# Altium integrated library controleo3_clone.IntLib: 45 symbols
Pins are listed as number, name and electrical type; pins without a type are passive.

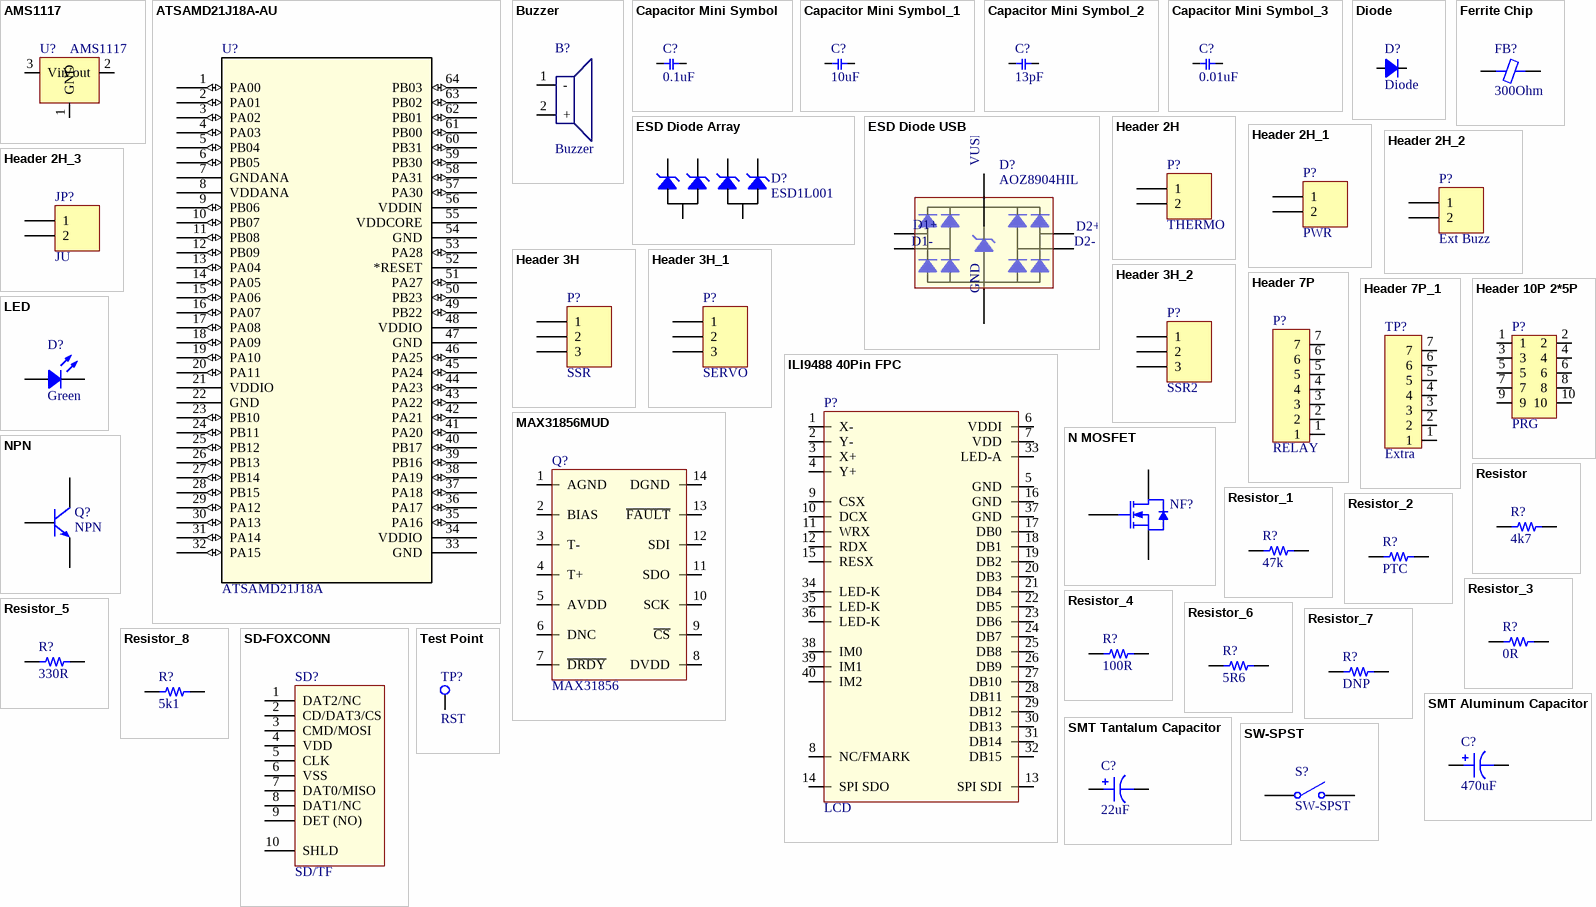
[diagram p0: symbols AMS1117 to Test Point]

## AMS1117
designator U?
Fixed Voltage Regulator; Mfr 1: Texas Instruments; Notes: *
footprint SOT-223 2,4 Jumper (SOT-223/SC-73; 4 Leads; Body 6.7 x 7.3 mm, inc. leads (LxW max))
pins: 1 GND, 2 Vout, 3 Vin (power)

## ATSAMD21J18A-AU
designator U?, comment ATSAMD21J18A
No Description Available; Mfr_Name: Microchip; Manufacturer_Part_Number: ATSAMD21J18A-AU; Copyright: Copyright (C) 2022 Ultra Librarian. All rights reserved.; RefDes: RefDes; Type: DEV
footprint TQFP64_10x10MC_MCH
footprint TQFP64_10x10MC_MCH-M
pins: 1 PA00 (io), 2 PA01 (io), 3 PA02 (io), 4 PA03 (io), 5 PB04 (io), 6 PB05 (io), 7 GNDANA, 8 VDDANA (power), 9 PB06 (io), 10 PB07 (io), 11 PB08 (io), 12 PB09 (io), 13 PA04 (io), 14 PA05 (io), 15 PA06 (io), 16 PA07 (io), 17 PA08 (io), 18 PA09 (io), 19 PA10 (io), 20 PA11 (io), 21 VDDIO (power), 22 GND, 23 PB10 (io), 24 PB11 (io), 25 PB12 (io), 26 PB13 (io), 27 PB14 (io), 28 PB15 (io), 29 PA12 (io), 30 PA13 (io), 31 PA14 (io), 32 PA15 (io), 33 GND, 34 VDDIO (power), 35 PA16 (io), 36 PA17 (io), 37 PA18 (io), 38 PA19 (io), 39 PB16 (io), 40 PB17 (io), 41 PA20 (io), 42 PA21 (io), 43 PA22 (io), 44 PA23 (io), 45 PA24 (io), 46 PA25 (io), 47 GND, 48 VDDIO (power), 49 PB22 (io), 50 PB23 (io), 51 PA27 (io), 52 *RESET, 53 PA28 (io), 54 GND, 55 VDDCORE (power), 56 VDDIN (power), 57 PA30 (io), 58 PA31 (io), 59 PB30 (io), 60 PB31 (io), 61 PB00 (io), 62 PB01 (io), 63 PB02 (io), 64 PB03 (io)

## Buzzer
designator B?
footprint Buzzer
footprint Buzzer - SMD 5mm
footprint Buzzer - Multi (Multiple Buzzer Footprint)
pins: 1 -, 2 +

## Capacitor Mini Symbol
designator C?, comment 0.1uF
SMT Capacitor; Value: 0.1uF
footprint CAP 0805/2012 RF (Chip Capacitor, 2-Leads, Body 2.00x1.20mm, IPC High Density)
footprint CAP 1206/3216 - 0.8MM (Chip Capacitor, 2-Leads, Body 3.25x1.60mm, IPC Medium Density)
footprint RES 0805/2012 RF Min (Chip Resistor, 2-Leads, Body 2.00x1.25mm, IPC High Density)
footprint CAP 0603 RF (0603 RF)
footprint CAP ALUM 8.3MM (Aluminum Electrolytic Capacitor, Body 8.30x8.30x10.50mm, IPC Low Density)
footprint CAP 1210/3225 - 1.4MM (Chip Capacitor, 2-Leads, Body 3.20x2.50mm, IPC Medium Density)
pins: 1, 2

## Capacitor Mini Symbol_1
designator C?, comment 10uF
SMT Capacitor; Value: 10uF
footprint CAP 0805/2012 RF (Chip Capacitor, 2-Leads, Body 2.00x1.20mm, IPC High Density)
footprint CAP 1206/3216 - 0.8MM (Chip Capacitor, 2-Leads, Body 3.25x1.60mm, IPC Medium Density)
footprint RES 0805/2012 RF Min (Chip Resistor, 2-Leads, Body 2.00x1.25mm, IPC High Density)
footprint CAP 0603 RF (0603 RF)
footprint CAP ALUM 8.3MM (Aluminum Electrolytic Capacitor, Body 8.30x8.30x10.50mm, IPC Low Density)
footprint CAP 1210/3225 - 1.4MM (Chip Capacitor, 2-Leads, Body 3.20x2.50mm, IPC Medium Density)
pins: 1, 2

## Capacitor Mini Symbol_2
designator C?, comment 13pF
SMT Capacitor; Value: 13pF
footprint CAP 0805/2012 RF (Chip Capacitor, 2-Leads, Body 2.00x1.20mm, IPC High Density)
footprint CAP 1206/3216 - 0.8MM (Chip Capacitor, 2-Leads, Body 3.25x1.60mm, IPC Medium Density)
footprint RES 0805/2012 RF Min (Chip Resistor, 2-Leads, Body 2.00x1.25mm, IPC High Density)
footprint CAP 0603 RF (0603 RF)
footprint CAP ALUM 8.3MM (Aluminum Electrolytic Capacitor, Body 8.30x8.30x10.50mm, IPC Low Density)
footprint CAP 1210/3225 - 1.4MM (Chip Capacitor, 2-Leads, Body 3.20x2.50mm, IPC Medium Density)
pins: 1, 2

## Capacitor Mini Symbol_3
designator C?, comment 0.01uF
SMT Capacitor; Value: 0.01uF
footprint CAP 0805/2012 RF (Chip Capacitor, 2-Leads, Body 2.00x1.20mm, IPC High Density)
footprint CAP 1206/3216 - 0.8MM (Chip Capacitor, 2-Leads, Body 3.25x1.60mm, IPC Medium Density)
footprint RES 0805/2012 RF Min (Chip Resistor, 2-Leads, Body 2.00x1.25mm, IPC High Density)
footprint CAP 0603 RF (0603 RF)
footprint CAP ALUM 8.3MM (Aluminum Electrolytic Capacitor, Body 8.30x8.30x10.50mm, IPC Low Density)
footprint CAP 1210/3225 - 1.4MM (Chip Capacitor, 2-Leads, Body 3.20x2.50mm, IPC Medium Density)
pins: 1, 2

## Diode
designator D?
footprint SOD-123
footprint SMA (DO-214-AC/SMA; 2 C-Bend Leads; Body 5 x 2.7 mm, inc. leads (LxW))
footprint SMB (DO-214-AA/SMB; 2 C-Bend Leads; Body 5.3 x 3.6 mm, inc. leads (LxW))
footprint SOD-323 (SOD-323/SC-76; 2 Leads; Body 1.7 x 1.3 mm, (LxW))
footprint SOD-123F
pins: 1, 2

## ESD Diode Array
designator D?, comment ESD1L001
ESD Protection Diode Array
footprint SC-88
footprint SC-70-6 - NC7WZ16-D
pins: 1, 2, 3, 4, 5, 6

## ESD Diode USB
designator D?, comment AOZ8904HIL
ESD Protection Diode
footprint SOT-23 (6) (SOT-23; 6 Leads; Body 3 x 3 mm, inc. leads (LxW max))
footprint SC-88
footprint SC-70-6
footprint SOT-23 (6) - Medium (SOT-23; 6 Leads; Body 3 x 3 mm, inc. leads (LxW max))
pins: 1 D1+, 2 GND, 3 D2-, 4 D2+, 5 VUSB, 6 D1-

## Ferrite Chip
designator FB?, comment 300Ohm
SMT Ferrite Chip
footprint RES 0603/1608 RF (Chip Resistor, 2-Leads, Body 1.60x0.80mm, IPC High Density)
pins: 1, 2

## Header 2H
designator P?, comment THERMO
Header, 2-Pin, Right Angle; LatestRevisionDate: 17-Jul-2002; LatestRevisionNote: Re-released for DXP Platform.; Publisher: Altium Limited
signal-integrity model Connector
footprint XH2 (Connector; Header; 2 Position)
footprint W237-102
footprint XT60BW (XT60 Connector)
footprint TJ8-2 (Connector; Header; 3 Position)
footprint Molex 3.96 (Connector; Header; 3 Position)
footprint J2 (Connector; Header; 2 Position)
footprint SH 1.0 * 2 (SH 1.0 * 2 Pins)
footprint XT30BW (XT60 Connector)
footprint EH 2P (EH 2 Pin Header)
footprint PH2 2 Pin (Connector; Header; 2 Position Vertical)
pins: 1, 2

## Header 2H_1
designator P?, comment PWR
Header, 2-Pin, Right Angle; LatestRevisionDate: 17-Jul-2002; LatestRevisionNote: Re-released for DXP Platform.; Publisher: Altium Limited
signal-integrity model Connector
footprint XH2 (Connector; Header; 2 Position)
footprint W237-102
footprint XT60BW (XT60 Connector)
footprint TJ8-2 (Connector; Header; 3 Position)
footprint Molex 3.96 (Connector; Header; 3 Position)
footprint J2 (Connector; Header; 2 Position)
footprint SH 1.0 * 2 (SH 1.0 * 2 Pins)
footprint XT30BW (XT60 Connector)
footprint EH 2P (EH 2 Pin Header)
footprint PH2 2 Pin (Connector; Header; 2 Position Vertical)
pins: 1, 2

## Header 2H_2
designator P?, comment Ext Buzz
Header, 2-Pin, Right Angle; LatestRevisionDate: 17-Jul-2002; LatestRevisionNote: Re-released for DXP Platform.; Publisher: Altium Limited
signal-integrity model Connector
footprint XH2 (Connector; Header; 2 Position)
footprint W237-102
footprint XT60BW (XT60 Connector)
footprint TJ8-2 (Connector; Header; 3 Position)
footprint Molex 3.96 (Connector; Header; 3 Position)
footprint J2 (Connector; Header; 2 Position)
footprint SH 1.0 * 2 (SH 1.0 * 2 Pins)
footprint XT30BW (XT60 Connector)
footprint EH 2P (EH 2 Pin Header)
footprint PH2 2 Pin (Connector; Header; 2 Position Vertical)
pins: 1, 2

## Header 2H_3
designator JP?, comment JU
Header, 2-Pin, Right Angle; LatestRevisionDate: 17-Jul-2002; LatestRevisionNote: Re-released for DXP Platform.; Publisher: Altium Limited
signal-integrity model Connector
footprint XH2 (Connector; Header; 2 Position)
footprint W237-102
footprint XT60BW (XT60 Connector)
footprint TJ8-2 (Connector; Header; 3 Position)
footprint Molex 3.96 (Connector; Header; 3 Position)
footprint J2 (Connector; Header; 2 Position)
footprint SH 1.0 * 2 (SH 1.0 * 2 Pins)
footprint XT30BW (XT60 Connector)
footprint EH 2P (EH 2 Pin Header)
footprint PH2 2 Pin (Connector; Header; 2 Position Vertical)
pins: 1, 2

## Header 3H
designator P?, comment SSR
Header, 3-Pin, Right Angle; LatestRevisionDate: 17-Jul-2002; LatestRevisionNote: Re-released for DXP Platform.; Publisher: Altium Limited
footprint HDR1X3H (Connector; Header; 3 Position; Right Angle)
signal-integrity model Connector
footprint XH3 (Connector; Header; 3 Position)
footprint W237-103
footprint TJ8-3 (Connector; Header; 3 Position)
footprint SH 1.0 * 3 (SH 1.0 * 3 Pins)
footprint JST-3-SMD
footprint 1X03_XH_LOCK
footprint DC044
footprint 2059-3
footprint GX12-3 (GX12 3Pin PCB Mount connector)
footprint PH2 3 Pin (Connector; Header; 3 Position Vertical)
footprint Header 3P - Outline (Header 3Pin)
footprint Header 3P (3 Pin Header)
pins: 1, 2, 3

## Header 3H_1
designator P?, comment SERVO
Header, 3-Pin, Right Angle; LatestRevisionDate: 17-Jul-2002; LatestRevisionNote: Re-released for DXP Platform.; Publisher: Altium Limited
footprint HDR1X3H (Connector; Header; 3 Position; Right Angle)
signal-integrity model Connector
footprint XH3 (Connector; Header; 3 Position)
footprint W237-103
footprint TJ8-3 (Connector; Header; 3 Position)
footprint SH 1.0 * 3 (SH 1.0 * 3 Pins)
footprint JST-3-SMD
footprint 1X03_XH_LOCK
footprint DC044
footprint 2059-3
footprint GX12-3 (GX12 3Pin PCB Mount connector)
footprint PH2 3 Pin (Connector; Header; 3 Position Vertical)
footprint Header 3P - Outline (Header 3Pin)
footprint Header 3P (3 Pin Header)
pins: 1, 2, 3

## Header 3H_2
designator P?, comment SSR2
Header, 3-Pin, Right Angle; LatestRevisionDate: 17-Jul-2002; LatestRevisionNote: Re-released for DXP Platform.; Publisher: Altium Limited
footprint HDR1X3H (Connector; Header; 3 Position; Right Angle)
signal-integrity model Connector
footprint XH3 (Connector; Header; 3 Position)
footprint W237-103
footprint TJ8-3 (Connector; Header; 3 Position)
footprint SH 1.0 * 3 (SH 1.0 * 3 Pins)
footprint JST-3-SMD
footprint 1X03_XH_LOCK
footprint DC044
footprint 2059-3
footprint GX12-3 (GX12 3Pin PCB Mount connector)
footprint PH2 3 Pin (Connector; Header; 3 Position Vertical)
footprint Header 3P - Outline (Header 3Pin)
footprint Header 3P (3 Pin Header)
pins: 1, 2, 3

## Header 7P
designator P?, comment RELAY
footprint Header 7P - Tall (7 Pin Header)
footprint Header 7P (7 Pin Header)
pins: 1, 2, 3, 4, 5, 6, 7

## Header 7P_1
designator TP?, comment Extra
footprint Header 7P - Tall (7 Pin Header)
footprint Header 7P (7 Pin Header)
pins: 1, 2, 3, 4, 5, 6, 7

## Header 10P 2*5P
designator P?, comment PRG
footprint Header 5*2P (Header 5*2Pin)
pins: 1, 2, 3, 4, 5, 6, 7, 8, 9, 10

## ILI9488 40Pin FPC
designator P?, comment LCD
footprint FPC 0.5 40Pin - Reverse (FPC 0.5 40Pin)
pins: 1 X- (power), 2 Y- (power), 3 X+ (power), 4 Y+ (power), 5 GND (power), 6 VDDI (power), 7 VDD (power), 8 NC/FMARK (power), 9 CSX (power), 10 DCX (power), 11 WRX (power), 12 RDX (power), 13 SPI SDI (power), 14 SPI SDO (power), 15 RESX (power), 16 GND (power), 17 DB0 (power), 18 DB1 (power), 19 DB2 (power), 20 DB3 (power), 21 DB4 (power), 22 DB5 (power), 23 DB6 (power), 24 DB7 (power), 25 DB8 (power), 26 DB9 (power), 27 DB10 (power), 28 DB11 (power), 29 DB12 (power), 30 DB13 (power), 31 DB14 (power), 32 DB15 (power), 33 LED-A (power), 34 LED-K (power), 35 LED-K (power), 36 LED-K (power), 37 GND (power), 38 IM0 (power), 39 IM1 (power), 40 IM2 (power)

## LED
designator D?, comment Green
Chip LED; Value: Green
footprint XP-E LED (CREE XP-E LED); pin to pad 1>Anode 2>Cathode
footprint OSRAM 3030 (OSRAM 3030 LED)
footprint Samsung 3030 (Samsung 3030 LED)
footprint 1206-OPTTRANS
footprint 3028
footprint RES 0603/1608 (Chip Resistor, 2-Leads, Body 1.60x0.80mm, IPC Medium Density)
footprint RES 0603/1608 RF (Chip Resistor, 2-Leads, Body 1.60x0.80mm, IPC High Density)
footprint LED 0603 Side View; pin to pad 1>2 2>1
footprint LED 0603 (Chip Capacitor, 2-Leads, Body 1.60x0.80mm, IPC High Density); pin to pad 1>2 2>1
footprint LED 0603/1608 RF - Red (Red LED 0603)
footprint LED 0603/1608 RF - Blue (Blue LED 0603)
footprint LED 3mm DIP (LED 3mm DIP package)
pins: 1, 2

## MAX31856MUD
designator Q?, comment MAX31856
footprint TSSOP14
pins: 1 AGND (power), 2 BIAS (power), 3 T- (power), 4 T+ (power), 5 AVDD (power), 6 DNC (power), 7 ~{DRDY} (power), 8 DVDD (power), 9 ~{CS} (power), 10 SCK (power), 11 SDO (power), 12 SDI (power), 13 ~{FAULT} (power), 14 DGND (power)

## N MOSFET
designator NF?
N-Channel MOSFET
footprint TO-252AA (D-PAK/TO-252-AA; 3 Leads (1 Cropped); Body 10.4 (inc. leads) x 6.7 mm (LxW max))
footprint SOT-223 (SOT-223/SC-73; 4 Leads; Body 6.7 x 7.3 mm, inc. leads (LxW max))
footprint SOT-23 (SOT-23; 3 Leads; Body 3.0 x 2.6 mm, inc. leads (LxW max)); pin to pad 3>2 4>3
footprint SOIC8; pin to pad 1>4 3>1 4>8
footprint SOT-23 (6) (SOT-23; 6 Leads; Body 3 x 3 mm, inc. leads (LxW max)); pin to pad 1>3 3>4 4>1，2，5，6
pins: 1 G, 3 S, 4 D

## NPN
designator Q?
NPN Transistor; Published: 8-Jun-2000; LatestRevisionDate: 29-May-2009; LatestRevisionNote: IPC-7351 Footprint Added.; PackageVersion: Aug-1999; PackageReference: SOT-23B; Publisher: Altium Limited; PackageDescription: 3-Pin SOT-23 Package 0.95 mm Pitch, 2.4 mm Lead Span
simulation model PNP
signal-integrity model PNP
footprint SC-75 (SOT-416/SC-90/SC-75; 3 Leads; Body 1.8 x 1.8 mm, inc. leads (LxW max)); pin to pad 1>2 2>1
footprint SOT-23 (SOT-23; 3 Leads; Body 3.0 x 2.6 mm, inc. leads (LxW max)); pin to pad 1>2 2>1
pins: 1 E, 2 B, 3 C

## Resistor
designator R?, comment 4k7
SMT Resistor; Value: 4k7
footprint RES 0805/2012 RF (Chip Resistor, 2-Leads, Body 2.00x1.25mm, IPC High Density)
footprint RES 1206/3216 RF (Chip Resistor, 2-Leads, Body 3.13x1.55mm, IPC High Density)
footprint CAP 1210/3225 - 1.2MM (Chip Capacitor, 2-Leads, Body 3.20x2.50mm, IPC Medium Density)
footprint RES 0603 RF (0603 Reflow)
footprint RES 2512 (Chip Resistor, 2-Leads, Body 3.13x1.55mm, IPC High Density)
pins: 1, 2

## Resistor_1
designator R?, comment 47k
SMT Resistor; Value: 47k
footprint RES 0805/2012 RF (Chip Resistor, 2-Leads, Body 2.00x1.25mm, IPC High Density)
footprint RES 1206/3216 RF (Chip Resistor, 2-Leads, Body 3.13x1.55mm, IPC High Density)
footprint CAP 1210/3225 - 1.2MM (Chip Capacitor, 2-Leads, Body 3.20x2.50mm, IPC Medium Density)
footprint RES 0603 RF (0603 Reflow)
footprint RES 2512 (Chip Resistor, 2-Leads, Body 3.13x1.55mm, IPC High Density)
pins: 1, 2

## Resistor_2
designator R?, comment PTC
SMT Resistor; Value: PTC
footprint RES 0805/2012 RF (Chip Resistor, 2-Leads, Body 2.00x1.25mm, IPC High Density)
footprint RES 1206/3216 RF (Chip Resistor, 2-Leads, Body 3.13x1.55mm, IPC High Density)
footprint CAP 1210/3225 - 1.2MM (Chip Capacitor, 2-Leads, Body 3.20x2.50mm, IPC Medium Density)
footprint RES 0603 RF (0603 Reflow)
footprint RES 2512 (Chip Resistor, 2-Leads, Body 3.13x1.55mm, IPC High Density)
pins: 1, 2

## Resistor_3
designator R?, comment 0R
SMT Resistor; Value: 0R
footprint RES 0805/2012 RF (Chip Resistor, 2-Leads, Body 2.00x1.25mm, IPC High Density)
footprint RES 1206/3216 RF (Chip Resistor, 2-Leads, Body 3.13x1.55mm, IPC High Density)
footprint CAP 1210/3225 - 1.2MM (Chip Capacitor, 2-Leads, Body 3.20x2.50mm, IPC Medium Density)
footprint RES 0603 RF (0603 Reflow)
footprint RES 2512 (Chip Resistor, 2-Leads, Body 3.13x1.55mm, IPC High Density)
pins: 1, 2

## Resistor_4
designator R?, comment 100R
SMT Resistor; Value: 100R
footprint RES 0805/2012 RF (Chip Resistor, 2-Leads, Body 2.00x1.25mm, IPC High Density)
footprint RES 1206/3216 RF (Chip Resistor, 2-Leads, Body 3.13x1.55mm, IPC High Density)
footprint CAP 1210/3225 - 1.2MM (Chip Capacitor, 2-Leads, Body 3.20x2.50mm, IPC Medium Density)
footprint RES 0603 RF (0603 Reflow)
footprint RES 2512 (Chip Resistor, 2-Leads, Body 3.13x1.55mm, IPC High Density)
pins: 1, 2

## Resistor_5
designator R?, comment 330R
SMT Resistor; Value: 330R
footprint RES 0805/2012 RF (Chip Resistor, 2-Leads, Body 2.00x1.25mm, IPC High Density)
footprint RES 1206/3216 RF (Chip Resistor, 2-Leads, Body 3.13x1.55mm, IPC High Density)
footprint CAP 1210/3225 - 1.2MM (Chip Capacitor, 2-Leads, Body 3.20x2.50mm, IPC Medium Density)
footprint RES 0603 RF (0603 Reflow)
footprint RES 2512 (Chip Resistor, 2-Leads, Body 3.13x1.55mm, IPC High Density)
pins: 1, 2

## Resistor_6
designator R?, comment 5R6
SMT Resistor; Value: 5R6
footprint RES 0805/2012 RF (Chip Resistor, 2-Leads, Body 2.00x1.25mm, IPC High Density)
footprint RES 1206/3216 RF (Chip Resistor, 2-Leads, Body 3.13x1.55mm, IPC High Density)
footprint CAP 1210/3225 - 1.2MM (Chip Capacitor, 2-Leads, Body 3.20x2.50mm, IPC Medium Density)
footprint RES 0603 RF (0603 Reflow)
footprint RES 2512 (Chip Resistor, 2-Leads, Body 3.13x1.55mm, IPC High Density)
pins: 1, 2

## Resistor_7
designator R?, comment DNP
SMT Resistor; Value: DNP
footprint RES 0805/2012 RF (Chip Resistor, 2-Leads, Body 2.00x1.25mm, IPC High Density)
footprint RES 1206/3216 RF (Chip Resistor, 2-Leads, Body 3.13x1.55mm, IPC High Density)
footprint CAP 1210/3225 - 1.2MM (Chip Capacitor, 2-Leads, Body 3.20x2.50mm, IPC Medium Density)
footprint RES 0603 RF (0603 Reflow)
footprint RES 2512 (Chip Resistor, 2-Leads, Body 3.13x1.55mm, IPC High Density)
pins: 1, 2

## Resistor_8
designator R?, comment 5k1
SMT Resistor; Value: 5k1
footprint RES 0805/2012 RF (Chip Resistor, 2-Leads, Body 2.00x1.25mm, IPC High Density)
footprint RES 1206/3216 RF (Chip Resistor, 2-Leads, Body 3.13x1.55mm, IPC High Density)
footprint CAP 1210/3225 - 1.2MM (Chip Capacitor, 2-Leads, Body 3.20x2.50mm, IPC Medium Density)
footprint RES 0603 RF (0603 Reflow)
footprint RES 2512 (Chip Resistor, 2-Leads, Body 3.13x1.55mm, IPC High Density)
pins: 1, 2

## SD-FOXCONN
designator SD?, comment SD/TF
footprint SD/TF Card Socket (Foxconn WQ21801-B2180-7F_C2836427)
pins: 1 DAT2/NC, 2 CD/DAT3/CS, 3 CMD/MOSI, 4 VDD, 5 CLK, 6 VSS, 7 DAT0/MISO, 8 DAT1/NC, 9 DET (NO), 10 SHLD

## SMT Aluminum Capacitor
designator C?, comment 470uF
SMT Aluminum Capacitor; Value: 470uF
footprint CAP ALUM 6.6MM (Aluminum Electrolytic Capacitor, Body 6.60x6.60x7.70mm, IPC Low Density)
footprint CAP ALUM 8.3MM (Aluminum Electrolytic Capacitor, Body 8.30x8.30x10.50mm, IPC Low Density)
footprint CAP ALUM 10.3MM (Aluminum Electrolytic Capacitor, Body 10.30x10.30x10.50mm, IPC Low Density)
footprint CAP ALUM 5.0MM Size C (Aluminum Electrolytic Capacitor, Body 5.0*5.4mm, IPC Low Density)
footprint CAP ALUM 8.0MM Size E (Aluminum Electrolytic Capacitor, Body 8*6.2mm, IPC Low Density)
pins: 1, 2

## SMT Tantalum Capacitor
designator C?, comment 22uF
Value: 22uF
footprint CAP POL 2917/7343 (Molded Capacitor, 2-Leads, Body 7.30x4.30mm, IPC Medium Density)
footprint CAP Pol 1210/3225 - 2.5MM (Chip Capacitor, 2-Leads, Body 3.20x2.50mm, IPC Medium Density)
footprint CAP Pol 1206/3216 - 1.8MM - duplicate (Tantalum Capacitor, 2-Leads, Body 3.25x1.60mm, IPC Medium Density)
footprint CAP POL 22312/6032 (Molded Capacitor, 2-Leads, Body 7.30x4.30mm, IPC Medium Density)
pins: 1, 2

## SW-SPST
designator S?
Single-Pole, Single-Throw Switch; Published: 24-Mar-1999; LatestRevisionDate: 17-Jul-2002; LatestRevisionNote: Re-released for DXP Platform.; PackageReference: SPST-2; Publisher: Altium Limited; PackageDescription: Switch; 2 Leads
footprint SPST-2 (Switch; 2 Leads)
footprint TACTILE_SWITCH_TALL
footprint Switch 2x3x4.5 SMD and SH1.0 (Switch 2x3x4.5 SMD)
footprint KMR4SWITCH
footprint K SW (Kailh MX Switch socket)
footprint SMD Button 4x4 (SMD Buttong 4x4)
footprint TACTILE_SWITCH_HORZ (Tactile Switch Horizontal)
pins: 1 COMMON, 2 NO

## Test Point
designator TP?, comment RST
footprint Test_Pad (0.6 * 1.5mm Test Pad)
footprint Test_Pad 2 (1mm Test Pad)
footprint Header 1P (1 Pin Header)
pins: 1 TP

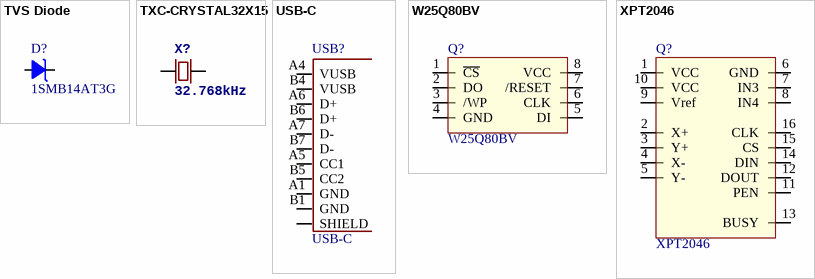
[diagram p1: symbols TVS Diode to XPT2046]

## TVS Diode
designator D?, comment 1SMB14AT3G
TVS Diode
footprint SOD-123
footprint SMA (DO-214-AC/SMA; 2 C-Bend Leads; Body 5 x 2.7 mm, inc. leads (LxW))
footprint SMB (DO-214-AA/SMB; 2 C-Bend Leads; Body 5.3 x 3.6 mm, inc. leads (LxW))
footprint SOD-323 (SOD-323/SC-76; 2 Leads; Body 1.7 x 1.3 mm, (LxW))
footprint SOD-123F
pins: 1, 2

## TXC-CRYSTAL32X15
designator X?, comment 32.768kHz
footprint TXC-SMD-32X15
pins: P$1, P$2

## USB-C
designator USB?
USB C mid board connector
footprint USBC1 (USB C mid board connector)
footprint USBC 8Pin (USB C 8 Pin Connector (USB 3.1)); pin to pad A1>A12 A4>A9 B1>B12 B4>B9
footprint USBC 8Pin - Long Pins (USB C 8 Pin Connector (USB 3.1))
footprint USBC2 (USB C connector); pin to pad 1>0
pins: 1 SHIELD (power), A1 GND (power), A4 VUSB (power), A5 CC1, A6 D+, A7 D-, B1 GND (power), B4 VUSB (power), B5 CC2, B6 D+, B7 D-

## W25Q80BV
designator Q?
footprint VSSOP8 (VSSOP8 TPA2005D1-Q1)
footprint SOIC8 - 208-mil
pins: 1 ~{CS} (power), 2 DO (power), 3 /WP (power), 4 GND (power), 5 DI (power), 6 CLK (power), 7 /RESET (power), 8 VCC (power)

## XPT2046
designator Q?
footprint TSSOP16 (TI TSC2007)
pins: 1 VCC (power), 2 X+ (power), 3 Y+ (power), 4 X- (power), 5 Y- (power), 6 GND (power), 7 IN3 (power), 8 IN4 (power), 9 Vref (power), 10 VCC (power), 11 PEN (power), 12 DOUT (power), 13 BUSY (power), 14 DIN (power), 15 CS (power), 16 CLK (power)